# Altium footprint library ThanhNT.PcbLib: 579 footprints (part 13 of 37)
Each footprint in its own frame and in the unit in brackets; x right, y up, seen from the top. Pads: shape width x height; smd on the part's side, far side on the other; paste and mask are expansions set on the pad; w line width, h text height; cw(c..) or ccw(c..) is an arc to the next point about the centre after c.
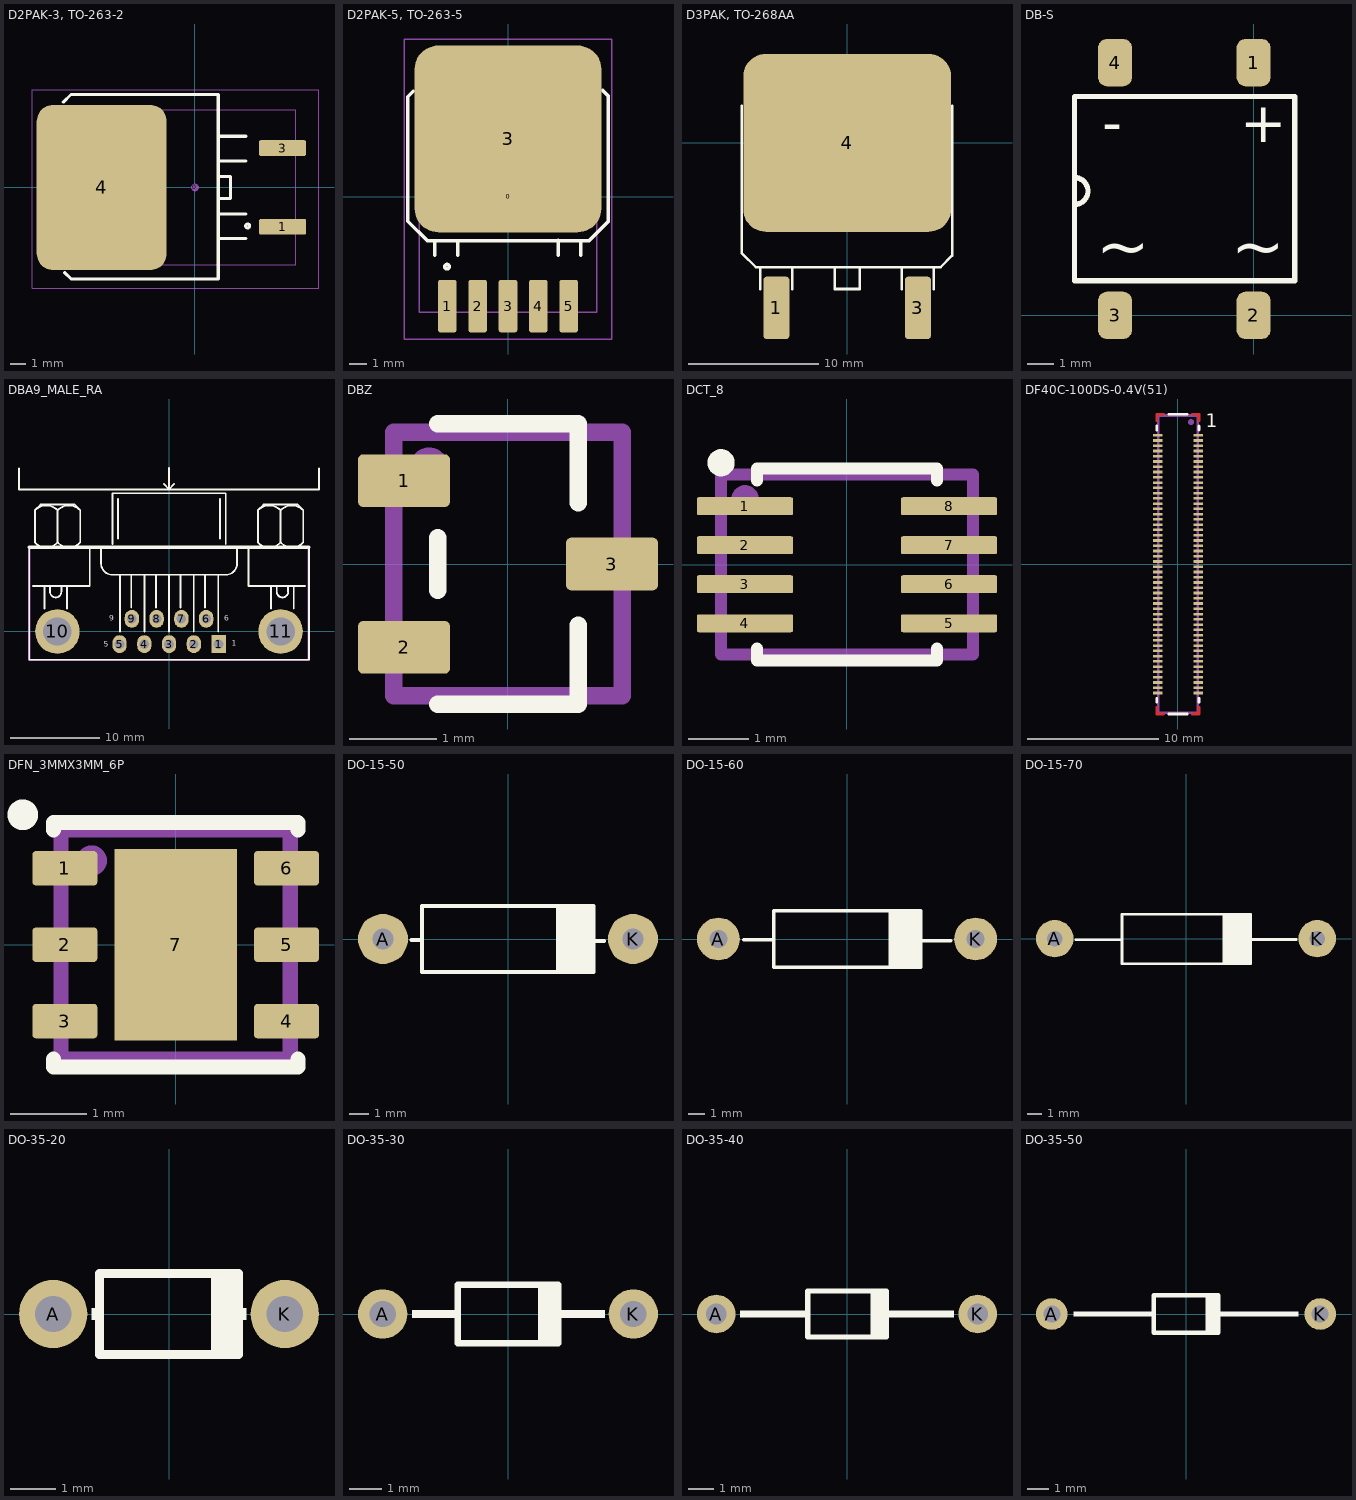
[diagram p12: the footprints below, top view; thin cyan lines are the x and y axes]

## D2PAK-3, TO-263-2 [mil] "D-PAK/TO-263-3; 3 Leads (1 Cropped); Body 14.7 (inc. leads) x 10.2 mm (LxW max)"
height 180
pads (4):
  round 20 on Mech15: 0(0,0)
  rrect25% 120x40 smd: 1(222.5,-100) 3(222.5,100)
  rrect25% 330x420 smd: 4(-237,0)
Top Overlay:
  circle w7.87: c133.8,-97.83 r4.92
  lines w7.87: -334.65,216.54 -314.96,236.22 59.06,236.22 59.06,-232.28 -314.96,-232.28 -330.71,-216.54 ; 129.92,-129.92 59.06,-129.92 59.06,-66.93 129.92,-66.93 ; 129.92,66.93 59.06,66.93 59.06,129.92 129.92,129.92 ; 59.06,-27.56 90.55,-27.56 90.55,27.56 59.06,27.56 59.06,-27.56
Mechanical 13:
  lines w3: -361.41,-196.85 -361.41,196.85 255.51,196.85 255.51,-196.85 -361.41,-196.85
Mechanical 15:
  lines w3: -413.39,-255.91 314.96,-255.91 314.96,248.03 -413.39,248.03 -413.39,-255.91
3D body "SW3dPS-TO263-3S.STEP": height 189.36, standoff 0.39, extent -361.41,-196.85 255.51,196.85

## D2PAK-5, TO-263-5 [mm] "D-PAK/TO-263-5; 5 Leads; Body 14.4 (inc. leads) x 10.4 mm (LxW max)"
height 4.65
pads (7):
  round 0.5 on Mech15: 0(0,0)
  rrect25% 1.05x2.95 smd: 1(-3.41,-6.15) 2(-1.705,-6.15) 3(0,-6.15) 4(1.705,-6.15) 5(3.41,-6.15)
  rrect25% 10.5x10.5 smd: 3(0,3.25)
Top Overlay:
  circle w0.2: c-3.429,-3.937 r0.125
  lines w0.2: -5.334,5.918 -5.639,5.613 -5.639,-1.372 -4.545,-2.465 4.571,-2.465 5.639,-1.397 5.639,5.613 5.639,5.664 5.334,5.969 ; -4.115,-3.302 -4.115,-2.489 ; -2.819,-3.278 -2.819,-2.465 ; 2.819,-3.277 2.819,-2.464 ; 4.089,-3.278 4.089,-2.465
Mechanical 13:
  lines w0.076: -5,-6.49 5,-6.49 5,7.061 -5,7.061 -5,-6.49
Mechanical 15:
  lines w0.076: -5.842,-8 5.842,-8 5.842,8.865 -5.842,8.865 -5.842,-8
3D body "User Library-D²PAK TO-263-5.STEP": height 4.87, standoff 0, extent -5.08,-6.735 5.08,7.495

## D3PAK, TO-268AA [mm]
pads (3):
  rrect25% 2x4.8 smd: 1(-5.45,-12.7) 3(5.45,-12.7)
  rrect25% 16x13.7 smd: 4(0,0)
Top Overlay:
  lines w0.2: -8.103,2.845 -8.103,-8.509 -7.036,-9.576 7.188,-9.576 8.077,-8.687 8.077,2.845 ; -6.68,-11.252 -6.68,-9.576 ; -4.216,-11.252 -4.216,-9.576 ; -0.965,-9.576 -0.965,-11.252 0.965,-11.252 0.965,-9.576 ; 4.216,-11.252 4.216,-9.576 ; 6.68,-11.252 6.68,-9.576
3D body "User Library-D3PAK-TO-268AA.STEP": height 5.1, standoff 0, extent -8.001,-13.627 8.001,5.423

## DB-S [mil] "Bridge Diode Rectron (DB101s-107s)"
pads (4):
  rrect50% 50x70 smd: 1(0,374) 2(0,0) 3(-205,0) 4(-205,374)
Top Overlay:
  lines w7.87: -265,164 ccw(c-265,184) -265,204 ; -265,51 -265,324 61,324 61,51 -265,51
  text "~" at -33,47 h118.11
  text "~" at -233,47 h118.11
  text "-" at -224,256 h60
  text "+" at -20,256 h60
3D body "User Library-DFS.STEP": height 102.76, standoff 0.6, extent -263.84,-15.76 59,389.76

## DBA9_MALE_RA [mm]
pads (11):
  rect 1.6x2 hole 1.09: 1(5.556,-1.418)
  oval 1.6x2 hole 1.09: 2(2.783,-1.418) 3(0.011,-1.418) 4(-2.762,-1.418) 5(-5.535,-1.418) 6(4.159,1.418) 7(1.386,1.418) 8(-1.386,1.418) 9(-4.159,1.418)
  round 5 hole 3.18: 10(-12.499,0) 11(12.499,0)
Top Overlay:
  lines w0.2: -16.8,15.9 -16.8,18.25 ; -0.6,16.55 0,15.95 ; 0,18.3 0,15.95 ; 0.6,16.55 0,15.95 ; 16.8,15.9 16.8,18.25
  lines w0.203: -16.8,15.9 16.8,15.9 ; -15.653,9.418 -15.653,-3.175 15.674,-3.175 15.674,9.418 ; -15.229,5.08 -8.879,5.08 -8.879,9.518 ; -15.02,9.974 ccw(c-13.748,11.247) -12.476,9.974 ; -15.02,13.577 cw(c-13.748,12.305) -12.476,13.577 ; -14.383,9.342 -15.018,9.977 -15.018,13.575 -14.383,14.21 -10.573,14.21 -9.938,13.575 -9.938,9.977 -10.573,9.342 ; -13.959,2.54 -13.959,5.08 ; -13.324,5.08 -13.324,4.445 ccw(c-12.689,4.445) -12.054,4.445 -12.054,5.08 ; -12.48,9.974 ccw(c-11.208,11.247) -9.936,9.974 ; -12.48,13.577 cw(c-11.208,12.305) -9.936,13.577 ; -12.478,9.977 -12.478,13.575 ; -11.419,2.54 -11.419,5.08 ; -7.609,9.418 -7.609,7.62 ccw(c-6.339,7.62) -6.339,6.35 6.361,6.35 ccw(c6.361,7.62) 7.631,7.62 7.631,9.518 ; -6.339,9.765 -6.339,15.48 6.361,15.48 6.361,9.765 ; -5.704,10.4 -5.704,14.845 ; -5.493,0 -5.493,6.35 ; -4.223,2.7 -4.223,6.35 ; -2.741,0 -2.741,6.35 ; -1.471,2.7 -1.471,6.35 ; 0.011,0 0.011,6.35 ; 1.281,2.7 1.281,6.35 ; 2.762,0 2.762,6.35 ; 4.032,2.7 4.032,6.35 ; 5.514,0 5.514,6.35 ; 5.726,10.4 5.726,14.845 ; 8.901,9.418 8.901,5.08 15.251,5.08 ; 9.957,9.974 ccw(c11.229,11.247) 12.501,9.974 ; 9.957,13.577 cw(c11.229,12.305) 12.501,13.577 ; 10.594,9.342 9.959,9.977 9.959,13.575 10.594,14.21 14.404,14.21 15.039,13.575 15.039,9.977 14.404,9.342 ; 11.441,2.54 11.441,5.08 ; 12.076,5.08 12.076,4.445 ccw(c12.711,4.445) 13.346,4.445 13.346,5.08 ; 12.497,9.974 ccw(c13.769,11.247) 15.041,9.974 ; 12.497,13.577 cw(c13.769,12.305) 15.041,13.577 ; 12.499,9.977 12.499,13.575 ; 13.981,2.54 13.981,5.08
  lines w0.4: -15.653,9.418 15.674,9.418
  text "6" at 6.2,1.2 h0.6
  text "1" at 7,-1.6 h0.6
  text "5" at -7.3,-1.7 h0.6
  text "9" at -6.7,1.2 h0.6
Mechanical 16:
  lines w0.254: -15.641,-3.182 15.659,-3.182 15.659,9.418 -15.641,9.418 -15.641,-3.182
3D body "c-1734351-1-a-3d.stp": height 12.45, standoff -4.15, extent -15.4,-2.9 15.4,15.5

## DBZ [mm]
pads (3):
  rrect20% 1.05x0.6 smd mask+0.07: 1(-1.185,0.95) 2(-1.185,-0.95) 3(1.185,0)
Top Overlay:
  lines w0.2: -0.8,-1.6 0.8,-1.6 0.8,-0.7 ; -0.8,-0.3 -0.8,0.3 ; -0.8,1.6 0.8,1.6 0.8,0.7
Mechanical 16:
  circle w0.254: c-0.9,1.1 r0.1
  lines w0.2: -1.3,-1.5 -1.3,1.5 1.3,1.5 1.3,-1.5 -1.3,-1.5
3D body "mf03a.stp": height 0.97, standoff -0.01, extent -1.257,-1.461 1.257,1.46

## DCT_8 [mm]
pads (8):
  rrect20% 1.6x0.3 smd mask+0.07: 1(-1.7,0.975) 2(-1.7,0.325) 3(-1.7,-0.325) 4(-1.7,-0.975) 5(1.7,-0.975) 6(1.7,-0.325) 7(1.7,0.325) 8(1.7,0.975)
Top Overlay:
  circle w0.254: c-2.1,1.7 r0.1
  lines w0.2: -1.5,-1.4 -1.5,-1.6 1.5,-1.6 1.5,-1.4 ; -1.5,1.4 -1.5,1.6 1.5,1.6 1.5,1.4
Mechanical 16:
  circle w0.254: c-1.7,1.1 r0.1
  lines w0.2: -2.1,-1.5 -2.1,1.5 2.1,1.5 2.1,-1.5 -2.1,-1.5
3D body "DCT-8.STEP": height 1.3, standoff 0, extent -2.1,-1.525 2.1,1.525

## DF40C-100DS-0.4V(51) [mm]
pads (100):
  rect 0.7x0.2 smd mask+0.03: 1(1.54,9.8) 2(-1.54,9.8) 3(1.54,9.4) 4(-1.54,9.4) 5(1.54,9) 6(-1.54,9) 7(1.54,8.6) 8(-1.54,8.6) 9(1.54,8.2) 10(-1.54,8.2) 11(1.54,7.8) 12(-1.54,7.8) 13(1.54,7.4) 14(-1.54,7.4) 15(1.54,7) 16(-1.54,7) 17(1.54,6.6) 18(-1.54,6.6) 19(1.54,6.2) 20(-1.54,6.2) 21(1.54,5.8) 22(-1.54,5.8) 23(1.54,5.4) 24(-1.54,5.4) 25(1.54,5) 26(-1.54,5) 27(1.54,4.6) 28(-1.54,4.6) 29(1.54,4.2) 30(-1.54,4.2) 31(1.54,3.8) 32(-1.54,3.8) 33(1.54,3.4) 34(-1.54,3.4) 35(1.54,3) 36(-1.54,3) 37(1.54,2.6) 38(-1.54,2.6) 39(1.54,2.2) 40(-1.54,2.2) 41(1.54,1.8) 42(-1.54,1.8) 43(1.54,1.4) 44(-1.54,1.4) 45(1.54,1) 46(-1.54,1) 47(1.54,0.6) 48(-1.54,0.6) 49(1.54,0.2) 50(-1.54,0.2) 51(1.54,-0.2) 52(-1.54,-0.2) 53(1.54,-0.6) 54(-1.54,-0.6) 55(1.54,-1) 56(-1.54,-1) 57(1.54,-1.4) 58(-1.54,-1.4) 59(1.54,-1.8) 60(-1.54,-1.8) 61(1.54,-2.2) 62(-1.54,-2.2) 63(1.54,-2.6) 64(-1.54,-2.6) 65(1.54,-3) 66(-1.54,-3) 67(1.54,-3.4) 68(-1.54,-3.4) 69(1.54,-3.8) 70(-1.54,-3.8) 71(1.54,-4.2) 72(-1.54,-4.2) 73(1.54,-4.6) 74(-1.54,-4.6) 75(1.54,-5) 76(-1.54,-5) 77(1.54,-5.4) 78(-1.54,-5.4) 79(1.54,-5.8) 80(-1.54,-5.8) 81(1.54,-6.2) 82(-1.54,-6.2) 83(1.54,-6.6) 84(-1.54,-6.6) 85(1.54,-7) 86(-1.54,-7) 87(1.54,-7.4) 88(-1.54,-7.4) 89(1.54,-7.8) 90(-1.54,-7.8) 91(1.54,-8.2) 92(-1.54,-8.2) 93(1.54,-8.6) 94(-1.54,-8.6) 95(1.54,-9) 96(-1.54,-9) 97(1.54,-9.4) 98(-1.54,-9.4) 99(1.54,-9.8) 100(-1.54,-9.8)
Top Layer:
  lines w0.2: -1.6,-10.9 -1.6,-11.4 -1.1,-11.4 ; -1.6,10.9 -1.6,11.4 -1.1,11.4 ; 1.1,-11.4 1.6,-11.4 1.6,-10.9 ; 1.1,11.4 1.6,11.4 1.6,10.9
Top Overlay:
  lines w0.2: -1.6,-10.5 -1.6,-10.2 ; -1.6,10.2 -1.6,10.5 ; -0.7,-11.4 0.7,-11.4 ; -0.7,11.4 0.7,11.4 ; 1.6,-10.5 1.6,-10.2 ; 1.6,10.2 1.6,10.5
  text "1" at 2.1,10.4 h1.02
Top Solder:
  lines w0.4: -1.6,-10.9 -1.6,-11.4 -1.1,-11.4 ; -1.6,10.9 -1.6,11.4 -1.1,11.4 ; 1.1,-11.4 1.6,-11.4 1.6,-10.9 ; 1.1,11.4 1.6,11.4 1.6,10.9
Mechanical 16:
  circle w0.254: c1,10.8 r0.1
  lines w0.2: -1.5,-11.3 1.5,-11.3 ; -1.5,-11.3 -1.5,11.3 1.5,11.3 1.5,-11.3 ; -1.5,-11.3 1.5,-11.3
3D body "DF40C-100DS.stp": height 1.45, standoff 0, extent -1.69,-11.3 1.69,11.3

## DFN_3MMX3MM_6P [mm]
pads (7):
  rrect20% 0.85x0.45 smd mask+0.045: 1(-1.45,1) 2(-1.45,0) 3(-1.45,-1) 4(1.45,-1) 5(1.45,0) 6(1.45,1)
  rect 1.6x2.5 smd mask+0.045: 7(0,0)
Top Overlay:
  circle w0.3: c-2,1.7 r0.05
  lines w0.2: -1.6,-1.5 -1.6,-1.6 1.6,-1.6 1.6,-1.5 ; -1.6,1.5 -1.6,1.6 1.6,1.6 1.6,1.5
Mechanical 16:
  circle w0.3: c-1.1,1.1 r0.05
  lines w0.2: -1.5,-1.5 -1.5,1.5 1.5,1.5 1.5,-1.5 -1.5,-1.5
3D body: height 1.13, standoff 1, extent -1.51,0 1.51,1.5
3D body "SHT21.step": height 1.12, standoff 0, extent -1.51,-1.5 1.51,1.5

## DO-15-50 [mil] "Diode, thru-hole, 500mil"
height 106.3
pads (2):
  round 100 hole 42 unplated: A(-250,0) K(250,0)
Top Overlay:
  rectangle: 100,-66 171,66
  lines w7.87: -193,-2 -172,-2 ; 100,-66 100,66 ; 171,-4 192,-4 ; -172,-66 171,-66 171,66 -172,66 -172,-66
3D body "User Library-DO-15-50.STEP": height 138.88, standoff -78.74, extent -269.67,-68.68 271.67,69

## DO-15-60 [mil] "Diode, thru-hole, 600mil"
height 106.3
pads (2):
  round 100 hole 42 unplated: A(-300,0) K(300,0)
Top Overlay:
  rectangle: 101,-66 172,66
  lines w7.87: -241,-2 -171,-2 ; 101,-66 101,66 ; 172,-4 242,-4 ; -171,-66 -171,66 172,66 172,-66 -171,-66
3D body "User Library-DO-15-60.STEP": height 138.88, standoff -78.74, extent -320.68,-68.69 320.66,68.99

## DO-15-70 [mil] "Diode, thru-hole, 700mil"
height 106.3
pads (2):
  round 100 hole 42 unplated: A(-350,0) K(350,0)
Top Overlay:
  rectangle: 101,-67 172,65
  lines w7.87: -293,-3 -171,-3 ; 101,-67 101,65 ; 172,-2 294,-2 ; -171,-67 -171,65 172,65 172,-67 -171,-67
3D body "User Library-DO-15-70.STEP": height 138.88, standoff -78.74, extent -370.68,-69.7 370.66,67.98

## DO-35-20 [mm] "DO-35 Glass 4mils, 200mil"
height 2
pads (2):
  round 1.5 hole 0.8: A(-2.54,0) K(2.54,0)
Top Overlay:
  rectangle: 1.575,-0.127 1.702,0.127
  rectangle: -1.702,-0.127 -1.575,0.127
  rectangle: 1.016,-0.889 1.524,0.889
  lines w0.2: 0.991,-0.889 1.016,-0.889 1.016,0.889 ; -1.524,-0.889 1.524,-0.889 1.524,0.889 -1.524,0.889 -1.524,-0.889
3D body "User Library-DO-35G-20.STEP": height 1.82, standoff -2, extent -2.815,-0.901 2.815,0.901

## DO-35-30 [mm] "DO-35 Glass 4mils, 300mil"
height 2
pads (2):
  round 1.5 hole 0.8: A(-3.81,0) K(3.81,0)
Top Overlay:
  rectangle: 1.016,-0.889 1.524,0.889
  rectangle: -2.921,-0.127 -1.575,0.127
  rectangle: 1.575,-0.127 2.946,0.127
  lines w0.2: 0.991,-0.889 1.016,-0.889 1.016,0.889 ; -1.524,-0.889 -1.524,0.889 1.524,0.889 1.524,-0.889 -1.524,-0.889
3D body "User Library-DO-35G-30.STEP": height 1.82, standoff -2, extent -4.085,-0.901 4.085,0.901

## DO-35-40 [mm] "DO-35 Glass 4mils, 400mil"
height 2
pads (2):
  round 1.5 hole 0.8: A(-5.08,0) K(5.08,0)
Top Overlay:
  rectangle: 1.575,-0.127 4.166,0.127
  rectangle: -4.166,-0.127 -1.575,0.127
  rectangle: 1.016,-0.889 1.524,0.889
  lines w0.2: 0.991,-0.889 1.016,-0.889 1.016,0.889 ; -1.524,-0.889 1.524,-0.889 1.524,0.889 -1.524,0.889 -1.524,-0.889
3D body "User Library-DO-35G-40D.STEP": height 1.82, standoff -2, extent -5.406,-0.901 5.304,0.901

## DO-35-50 [mm] "DO-35 Glass 4mils, 500mil"
height 2
pads (2):
  round 1.5 hole 0.8: A(-6.35,0) K(6.35,0)
Top Overlay:
  rectangle: 1.575,-0.127 5.334,0.127
  rectangle: -5.334,-0.127 -1.575,0.127
  rectangle: 1.016,-0.889 1.524,0.889
  lines w0.2: 0.991,-0.889 1.016,-0.889 1.016,0.889 ; -1.524,-0.889 1.524,-0.889 1.524,0.889 -1.524,0.889 -1.524,-0.889
3D body "User Library-DO-35G-50.STEP": height 1.82, standoff -2, extent -6.676,-0.901 6.574,0.901